# Altium footprint library RODION.PcbLib: 131 footprints (part 4 of 9)
Each footprint in its own frame and in the unit in brackets; x right, y up, seen from the top. Pads: shape width x height; smd on the part's side, far side on the other; paste and mask are expansions set on the pad; w line width, h text height; cw(c..) or ccw(c..) is an arc to the next point about the centre after c.
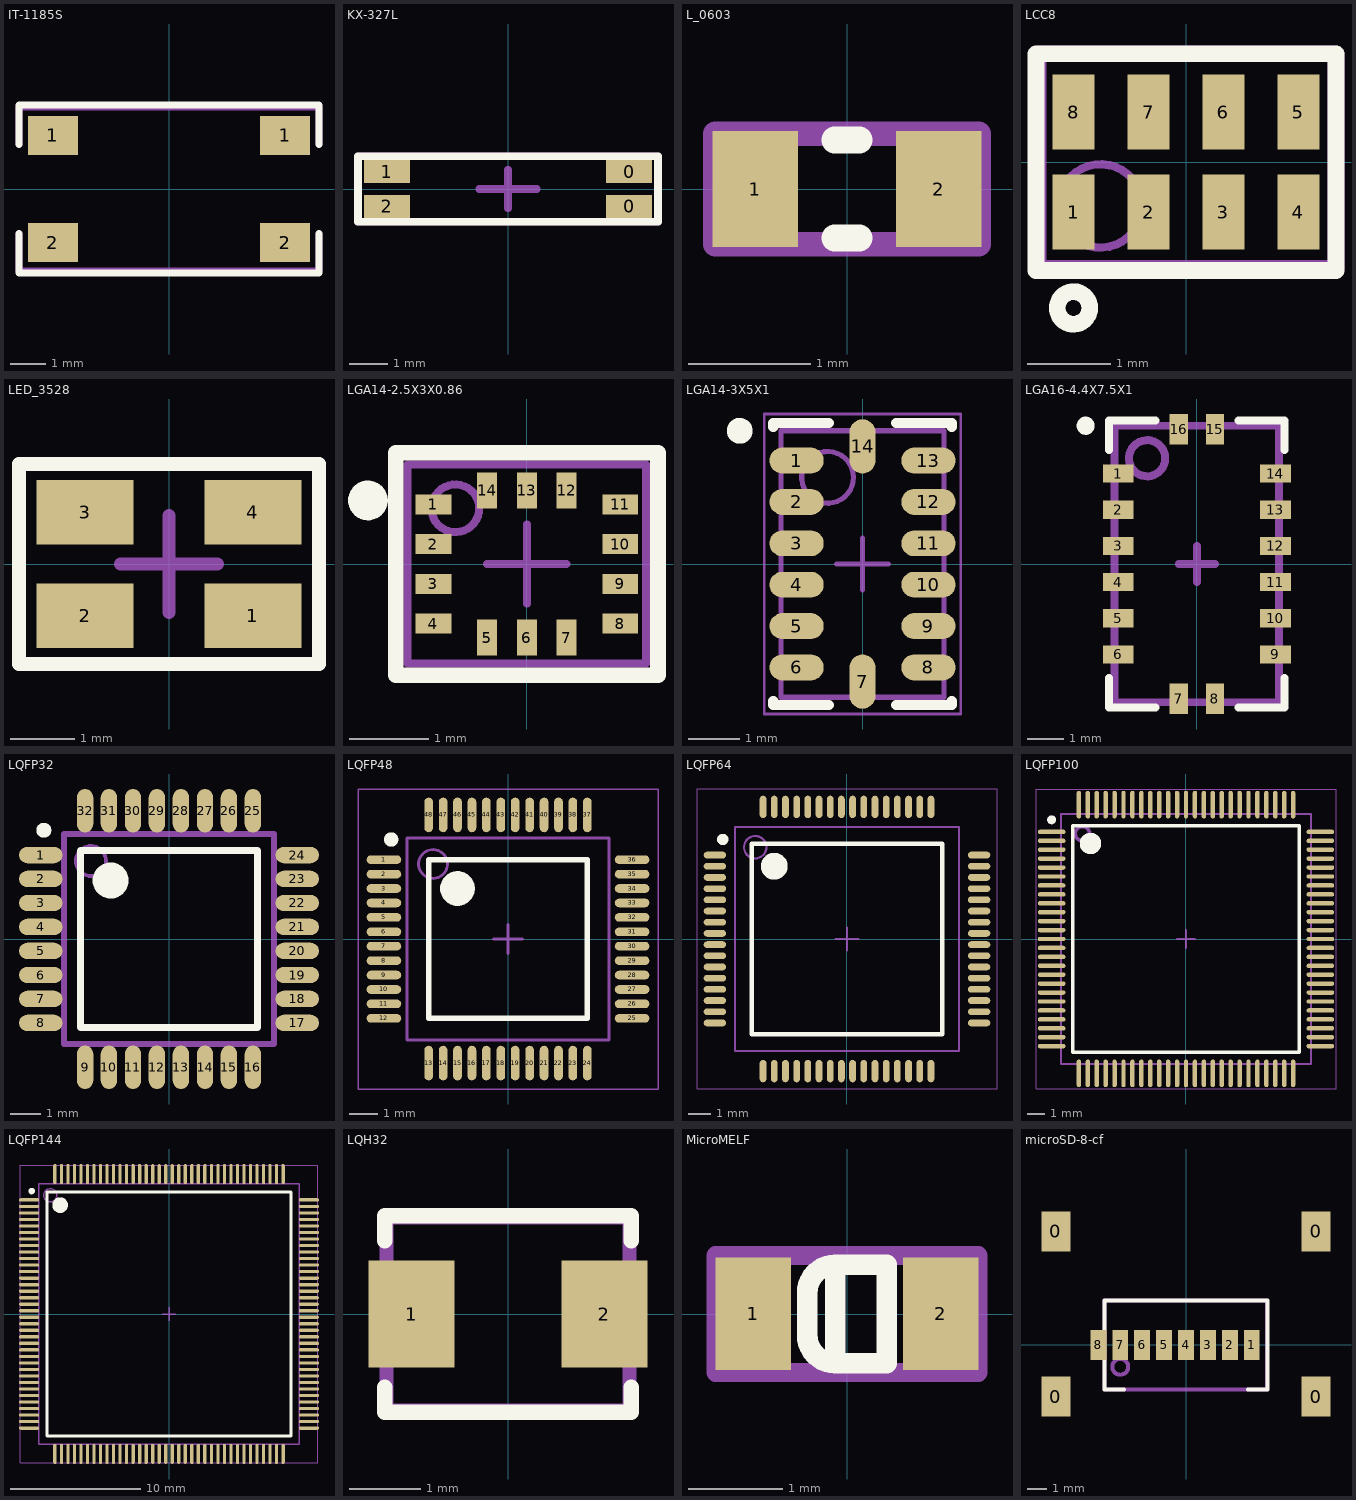
[diagram p3: the footprints below, top view; thin cyan lines are the x and y axes]

## IT-1185S [mm] "Button"
height 3.8
pads (4):
  rect 1.4x1.1 smd: 1(-3.25,1.5) 1(3.25,1.5) 2(-3.25,-1.5) 2(3.25,-1.5)
Top Overlay:
  lines w0.2: -4.2,-1.25 -4.2,-2.35 4.2,-2.35 4.2,-1.25 ; -4.2,1.25 -4.2,2.35 4.2,2.35 4.2,1.25
Top_Assy:
  lines w0.2: -4.2,-1.25 -4.2,-2.3 4.2,-2.3 4.2,-1.25 ; -4.2,1.25 -4.2,2.3 4.2,2.3 4.2,1.25
  text ".Designator" at -2.725,-0.1 h1
3D body "IT-1109S.STP": height 3.8, standoff 0, extent -3.75,-2.25 3.75,2.25

## KX-327L [mm] "GEYER 4pin crystal case, 7*1.5mm"
height 1.4
pads (4):
  rect 1.2x0.6 smd: 0(3.15,-0.45) 0(3.15,0.45) 1(-3.15,0.45) 2(-3.15,-0.45)
Top Overlay:
  lines w0.2: -3.9,-0.85 3.9,-0.85 3.9,0.85 -3.9,0.85 -3.9,-0.85
Top_Assy:
  lines w0.2: -0.75,0 0,0 ; 0,-0.5 0,0 ; 0,0.5 0,0 ; 0.75,0 0,0 ; -3.9,-0.85 3.9,-0.85 3.9,0.85 -3.9,0.85 -3.9,-0.85
3D body "Crystal KX-327LT.step": height 1.4, standoff 0, extent -3.45,-0.75 3.45,0.75

## L_0603 [mm] "Chip, Body 1.6x0.85mm, IPC High Density"
height 0.9
pads (2):
  rect 0.7x0.95 smd mask+0.05: 1(-0.75,0) 2(0.75,0)
Top Overlay:
  lines w0.22: -0.1,-0.4 0.1,-0.4 ; -0.1,0.4 0.1,0.4
Top_Assy:
  lines w0.2: -1.075,-0.45 1.075,-0.45 1.075,0.45 -1.075,0.45 -1.075,-0.45
  text ".Designator" at -0.875,-0.125 h1
3D body "0603.step": height 0.8, standoff 0, extent -0.8,-0.475 0.8,0.475

## LCC8 [mm] "0.5 pitch"
height 0.8
pads (8):
  rect 0.5x0.9 smd: 1(-1.35,-0.6) 2(-0.45,-0.6) 3(0.45,-0.6) 4(1.35,-0.6) 5(1.35,0.6) 6(0.45,0.6) 7(-0.45,0.6) 8(-1.35,0.6)
Top Overlay:
  circle w0.2: c-1.35,-1.75 r0.195
  lines w0.2: -1.8,-1.3 1.8,-1.3 1.8,1.3 -1.8,1.3 -1.8,-1.3
Top_Assy:
  circle w0.1: c-1.025,-0.525 r0.5
  lines w0.2: -1.775,-1.275 -1.775,1.3 1.8,1.3 1.8,-1.275 -1.775,-1.275
  text ".Designator" at -1.225,-0.125 h1
3D body "LCC8.step": height 0.82, standoff 0.02, extent -1.6,-0.75 1.6,0.75

## LED_3528 [mm] "3528 Led 4 pin"
height 1.9
pads (4):
  rect 1.5x1 smd: 1(1.3,-0.8) 2(-1.3,-0.8) 3(-1.3,0.8) 4(1.3,0.8)
Top Overlay:
  lines w0.22: -2.325,-1.55 2.325,-1.55 2.325,1.55 -2.325,1.55 -2.325,-1.55
Top_Assy:
  lines w0.2: -0.75,0 0,0 ; 0,-0.75 0,0 ; 0,0.75 0,0 ; 0.75,0 0,0 ; -2.325,-1.55 2.325,-1.55 2.325,1.55 -2.325,1.55 -2.325,-1.55
3D body "3528 LED.step": height 1.9, standoff 0, extent -1.75,-1.4 1.75,1.4

## LGA14-2.5X3X0.86 [mm] "PQFN, 14-Leads, Body 2.5x3mm, Pitch 0.5mm, IPC High Density"
height 0.86
pads (14):
  rect 0.45x0.25 smd: 1(-1.175,0.75) 2(-1.175,0.25) 3(-1.175,-0.25) 4(-1.175,-0.75) 8(1.175,-0.75) 9(1.175,-0.25) 10(1.175,0.25) 11(1.175,0.75)
  rect 0.25x0.45 smd: 5(-0.5,-0.925) 6(0,-0.925) 7(0.5,-0.925) 12(0.5,0.925) 13(0,0.925) 14(-0.5,0.925)
Top Overlay:
  circle w0.25: c-2,0.8 r0.125
  lines w0.2: -1.65,-1.4 -1.65,1.4 1.65,1.4 1.65,-1.4 -1.65,-1.4
Top_Assy:
  circle w0.1: c-0.9,0.7 r0.3
  lines w0.1: -1.5,-1.25 1.5,-1.25 1.5,1.25 -1.5,1.25 -1.5,-1.25
  text ".Designator" at -1.275,-0.875 h1
Mechanical 15:
  lines w0.1: -0.5,0 0.5,0 ; 0,-0.5 0,0.5
3D body "LGA-14 2.5x3.STEP": height 0.86, standoff 0, extent -1.5,-1.25 1.5,1.25

## LGA14-3X5X1 [mm] "PQFN, 14-Leads, Body 3x5mm, Pitch 0.8mm, IPC High Density"
height 1
pads (14):
  oval 1.05x0.5 smd: 1(-1.275,2) 2(-1.275,1.2) 3(-1.275,0.4) 4(-1.275,-0.4) 5(-1.275,-1.2) 6(-1.275,-2) 8(1.275,-2) 9(1.275,-1.2) 10(1.275,-0.4) 11(1.275,0.4) 12(1.275,1.2) 13(1.275,2)
  oval 0.5x1.05 smd: 7(0,-2.275) 14(0,2.275)
Top Overlay:
  circle w0.25: c-2.375,2.575 r0.125
  lines w0.2: -1.725,-2.65 -1.725,-2.725 -0.65,-2.725 ; -1.725,2.65 -1.725,2.725 -0.65,2.725 ; 0.65,-2.725 1.725,-2.725 1.725,-2.65 ; 0.65,2.725 1.725,2.725 1.725,2.65
Top_Assy:
  circle w0.1: c-0.675,1.675 r0.5
  lines w0.1: -1.575,-2.575 -1.575,2.575 1.575,2.575 1.575,-2.575 -1.575,-2.575
Mechanical 15:
  lines w0.05: -1.9,-2.9 -1.9,2.9 1.9,2.9 1.9,-2.9 -1.9,-2.9
  lines w0.1: -0.5,0 0.5,0 ; 0,-0.5 0,0.5
3D body "LGA-14 3x5.STEP": height 1.03, standoff -0.4, extent -1.49,-2.5 1.51,2.5

## LGA16-4.4X7.5X1 [mm] "PQFN, 16-Leads, Body 4.4x7.5mm, Pitch 1mm, IPC Medium Density"
height 1
pads (16):
  rect 0.85x0.5 smd: 1(-2.175,2.5) 2(-2.175,1.5) 3(-2.175,0.5) 4(-2.175,-0.5) 5(-2.175,-1.5) 6(-2.175,-2.5) 9(2.175,-2.5) 10(2.175,-1.5) 11(2.175,-0.5) 12(2.175,0.5) 13(2.175,1.5) 14(2.175,2.5)
  rect 0.5x0.85 smd: 7(-0.5,-3.725) 8(0.5,-3.725) 15(0.5,3.725) 16(-0.5,3.725)
Top Overlay:
  circle w0.25: c-3.075,3.825 r0.125
  lines w0.22: -2.425,-3.15 -2.425,-3.975 -1.15,-3.975 ; -2.425,3.15 -2.425,3.975 -1.15,3.975 ; 1.15,-3.975 2.425,-3.975 2.425,-3.15 ; 1.15,3.975 2.425,3.975 2.425,3.15
Top_Assy:
  circle w0.22: c-1.375,2.925 r0.5
  lines w0.22: -0.5,0 0.5,0 ; 0,-0.5 0,0.5 ; -2.275,-3.825 -2.275,3.825 2.275,3.825 2.275,-3.825 -2.275,-3.825
3D body: height 1, standoff 0, extent -2.275,-3.825 2.275,3.825

## LQFP32 [mm] "QFP, 32-Leads, Body 7x7mm, Pitch 0.8mm, IPC Medium Density"
height 1.6
pads (32):
  oval 1.45x0.55 smd: 1(-4.275,2.8) 2(-4.275,2) 3(-4.275,1.2) 4(-4.275,0.4) 5(-4.275,-0.4) 6(-4.275,-1.2) 7(-4.275,-2) 8(-4.275,-2.8) 17(4.275,-2.8) 18(4.275,-2) 19(4.275,-1.2) 20(4.275,-0.4) 21(4.275,0.4) 22(4.275,1.2) 23(4.275,2) 24(4.275,2.8)
  oval 0.55x1.45 smd: 9(-2.8,-4.275) 10(-2,-4.275) 11(-1.2,-4.275) 12(-0.4,-4.275) 13(0.4,-4.275) 14(1.2,-4.275) 15(2,-4.275) 16(2.8,-4.275) 25(2.8,4.275) 26(2,4.275) 27(1.2,4.275) 28(0.4,4.275) 29(-0.4,4.275) 30(-1.2,4.275) 31(-2,4.275) 32(-2.8,4.275)
Top Overlay:
  circle w0.25: c-4.175,3.625 r0.125
  circle w0.6: c-1.95,1.95 r0.3
  lines w0.22: -2.95,-2.95 -2.95,2.95 2.95,2.95 2.95,-2.95 -2.95,-2.95
Top_Assy:
  circle w0.127: c-2.6,2.6 r0.5
  lines w0.2: -3.5,-3.5 -3.5,3.5 3.5,3.5 3.5,-3.5 -3.5,-3.5
  text ".Designator" at -2.225,-0.625 h1
3D body "TQFP-32.STEP": height 1.1, standoff 0, extent -4.5,-4.5 4.5,4.5

## LQFP48 [mm] "QFP, 48-Leads, Body 7x7mm, Pitch 0.5mm, IPC Medium Density"
height 1.6
pads (48):
  oval 1.2x0.3 smd: 1(-4.3,2.75) 2(-4.3,2.25) 3(-4.3,1.75) 4(-4.3,1.25) 5(-4.3,0.75) 6(-4.3,0.25) 7(-4.3,-0.25) 8(-4.3,-0.75) 9(-4.3,-1.25) 10(-4.3,-1.75) 11(-4.3,-2.25) 12(-4.3,-2.75) 25(4.3,-2.75) 26(4.3,-2.25) 27(4.3,-1.75) 28(4.3,-1.25) 29(4.3,-0.75) 30(4.3,-0.25) 31(4.3,0.25) 32(4.3,0.75) 33(4.3,1.25) 34(4.3,1.75) 35(4.3,2.25) 36(4.3,2.75)
  oval 0.3x1.2 smd: 13(-2.75,-4.3) 14(-2.25,-4.3) 15(-1.75,-4.3) 16(-1.25,-4.3) 17(-0.75,-4.3) 18(-0.25,-4.3) 19(0.25,-4.3) 20(0.75,-4.3) 21(1.25,-4.3) 22(1.75,-4.3) 23(2.25,-4.3) 24(2.75,-4.3) 37(2.75,4.3) 38(2.25,4.3) 39(1.75,4.3) 40(1.25,4.3) 41(0.75,4.3) 42(0.25,4.3) 43(-0.25,4.3) 44(-0.75,4.3) 45(-1.25,4.3) 46(-1.75,4.3) 47(-2.25,4.3) 48(-2.75,4.3)
Top Overlay:
  circle w0.6: c-1.75,1.75 r0.3
  circle w0.25: c-4.05,3.45 r0.125
  lines w0.2: -2.75,-2.75 2.75,-2.75 2.75,2.75 -2.75,2.75 -2.75,-2.75
Top_Assy:
  circle w0.1: c-2.6,2.6 r0.5
  lines w0.1: -3.5,-3.5 3.5,-3.5 3.5,3.5 -3.5,3.5 -3.5,-3.5
  text ".Designator" at -2.275,-0.25 h1
Mechanical 15:
  lines w0.05: -5.2,-5.2 5.2,-5.2 5.2,5.2 -5.2,5.2 -5.2,-5.2
  lines w0.1: -0.5,0 0.5,0 ; 0,-0.5 0,0.5
3D body "LQFP48_Grid_0_5.X_B": height 1.6, standoff 0, extent -4.5,-4.5 4.5,4.5

## LQFP64 [mm] "Thin QFP, 64-Leads, Body 10x10mm, Pitch 0.5mm, IPC Medium Density"
height 1.6
pads (64):
  oval 1x0.3 smd: 1(-5.9,3.75) 2(-5.9,3.25) 3(-5.9,2.75) 4(-5.9,2.25) 5(-5.9,1.75) 6(-5.9,1.25) 7(-5.9,0.75) 8(-5.9,0.25) 9(-5.9,-0.25) 10(-5.9,-0.75) 11(-5.9,-1.25) 12(-5.9,-1.75) 13(-5.9,-2.25) 14(-5.9,-2.75) 15(-5.9,-3.25) 16(-5.9,-3.75) 33(5.9,-3.75) 34(5.9,-3.25) 35(5.9,-2.75) 36(5.9,-2.25) 37(5.9,-1.75) 38(5.9,-1.25) 39(5.9,-0.75) 40(5.9,-0.25) 41(5.9,0.25) 42(5.9,0.75) 43(5.9,1.25) 44(5.9,1.75) 45(5.9,2.25) 46(5.9,2.75) 47(5.9,3.25) 48(5.9,3.75)
  oval 0.3x1 smd: 17(-3.75,-5.9) 18(-3.25,-5.9) 19(-2.75,-5.9) 20(-2.25,-5.9) 21(-1.75,-5.9) 22(-1.25,-5.9) 23(-0.75,-5.9) 24(-0.25,-5.9) 25(0.25,-5.9) 26(0.75,-5.9) 27(1.25,-5.9) 28(1.75,-5.9) 29(2.25,-5.9) 30(2.75,-5.9) 31(3.25,-5.9) 32(3.75,-5.9) 49(3.75,5.9) 50(3.25,5.9) 51(2.75,5.9) 52(2.25,5.9) 53(1.75,5.9) 54(1.25,5.9) 55(0.75,5.9) 56(0.25,5.9) 57(-0.25,5.9) 58(-0.75,5.9) 59(-1.25,5.9) 60(-1.75,5.9) 61(-2.25,5.9) 62(-2.75,5.9) 63(-3.25,5.9) 64(-3.75,5.9)
Top Overlay:
  circle w0.6: c-3.25,3.25 r0.3
  circle w0.25: c-5.55,4.45 r0.125
  lines w0.2: -4.25,-4.25 4.25,-4.25 4.25,4.25 -4.25,4.25 -4.25,-4.25
Top_Assy:
  circle w0.1: c-4.1,4.1 r0.5
  lines w0.1: -5,-5 5,-5 5,5 -5,5 -5,-5
  text ".Designator" at -3.25,-0.2 h1
Mechanical 15:
  lines w0.05: -6.7,-6.7 6.7,-6.7 6.7,6.7 -6.7,6.7 -6.7,-6.7
  lines w0.1: -0.5,0 0.5,0 ; 0,-0.5 0,0.5
3D body "LQFP64_Grid_0_5.STEP": height 1.6, standoff 0, extent -6,-6 6,6

## LQFP100 [mm] "Thin QFP, 100-Leads, Body 14x14mm, Pitch 0.5mm, IPC High Density"
height 1.6
pads (100):
  oval 1.55x0.25 smd: 1(-7.525,6) 2(-7.525,5.5) 3(-7.525,5) 4(-7.525,4.5) 5(-7.525,4) 6(-7.525,3.5) 7(-7.525,3) 8(-7.525,2.5) 9(-7.525,2) 10(-7.525,1.5) 11(-7.525,1) 12(-7.525,0.5) 13(-7.525,0) 14(-7.525,-0.5) 15(-7.525,-1) 16(-7.525,-1.5) 17(-7.525,-2) 18(-7.525,-2.5) 19(-7.525,-3) 20(-7.525,-3.5) 21(-7.525,-4) 22(-7.525,-4.5) 23(-7.525,-5) 24(-7.525,-5.5) 25(-7.525,-6) 51(7.525,-6) 52(7.525,-5.5) 53(7.525,-5) 54(7.525,-4.5) 55(7.525,-4) 56(7.525,-3.5) 57(7.525,-3) 58(7.525,-2.5) 59(7.525,-2) 60(7.525,-1.5) 61(7.525,-1) 62(7.525,-0.5) 63(7.525,0) 64(7.525,0.5) 65(7.525,1) 66(7.525,1.5) 67(7.525,2) 68(7.525,2.5) 69(7.525,3) 70(7.525,3.5) 71(7.525,4) 72(7.525,4.5) 73(7.525,5) 74(7.525,5.5) 75(7.525,6)
  oval 0.25x1.55 smd: 26(-6,-7.525) 27(-5.5,-7.525) 28(-5,-7.525) 29(-4.5,-7.525) 30(-4,-7.525) 31(-3.5,-7.525) 32(-3,-7.525) 33(-2.5,-7.525) 34(-2,-7.525) 35(-1.5,-7.525) 36(-1,-7.525) 37(-0.5,-7.525) 38(0,-7.525) 39(0.5,-7.525) 40(1,-7.525) 41(1.5,-7.525) 42(2,-7.525) 43(2.5,-7.525) 44(3,-7.525) 45(3.5,-7.525) 46(4,-7.525) 47(4.5,-7.525) 48(5,-7.525) 49(5.5,-7.525) 50(6,-7.525) 76(6,7.525) 77(5.5,7.525) 78(5,7.525) 79(4.5,7.525) 80(4,7.525) 81(3.5,7.525) 82(3,7.525) 83(2.5,7.525) 84(2,7.525) 85(1.5,7.525) 86(1,7.525) 87(0.5,7.525) 88(0,7.525) 89(-0.5,7.525) 90(-1,7.525) 91(-1.5,7.525) 92(-2,7.525) 93(-2.5,7.525) 94(-3,7.525) 95(-3.5,7.525) 96(-4,7.525) 97(-4.5,7.525) 98(-5,7.525) 99(-5.5,7.525) 100(-6,7.525)
Top Overlay:
  circle w0.6: c-5.35,5.35 r0.3
  circle w0.25: c-7.525,6.675 r0.125
  lines w0.2: -6.35,-6.35 6.35,-6.35 6.35,6.35 -6.35,6.35 -6.35,-6.35
Top_Assy:
  circle w0.2: c-5.8,5.9 r0.4
  lines w0.1: -7,-7 7,-7 7,7 -7,7 -7,-7
  text ".Designator" at -4.325,-0.4 h1
Mechanical 15:
  lines w0.05: -8.4,-8.4 8.4,-8.4 8.4,8.4 -8.4,8.4 -8.4,-8.4
  lines w0.1: -0.5,0 0.5,0 ; 0,-0.5 0,0.5
3D body "LQFP100_Grid_0.5.step": height 1.6, standoff 0, extent -8,-8 8,8

## LQFP144 [mm] "Thin QFP, 144-Leads, Body 20x20mm, Pitch 0.5mm, IPC High Density"
height 1.6
pads (144):
  oval 1.55x0.25 smd: 1(-10.725,8.75) 2(-10.725,8.25) 3(-10.725,7.75) 4(-10.725,7.25) 5(-10.725,6.75) 6(-10.725,6.25) 7(-10.725,5.75) 8(-10.725,5.25) 9(-10.725,4.75) 10(-10.725,4.25) 11(-10.725,3.75) 12(-10.725,3.25) 13(-10.725,2.75) 14(-10.725,2.25) 15(-10.725,1.75) 16(-10.725,1.25) 17(-10.725,0.75) 18(-10.725,0.25) 19(-10.725,-0.25) 20(-10.725,-0.75) 21(-10.725,-1.25) 22(-10.725,-1.75) 23(-10.725,-2.25) 24(-10.725,-2.75) 25(-10.725,-3.25) 26(-10.725,-3.75) 27(-10.725,-4.25) 28(-10.725,-4.75) 29(-10.725,-5.25) 30(-10.725,-5.75) 31(-10.725,-6.25) 32(-10.725,-6.75) 33(-10.725,-7.25) 34(-10.725,-7.75) 35(-10.725,-8.25) 36(-10.725,-8.75) 73(10.725,-8.75) 74(10.725,-8.25) 75(10.725,-7.75) 76(10.725,-7.25) 77(10.725,-6.75) 78(10.725,-6.25) 79(10.725,-5.75) 80(10.725,-5.25) 81(10.725,-4.75) 82(10.725,-4.25) 83(10.725,-3.75) 84(10.725,-3.25) 85(10.725,-2.75) 86(10.725,-2.25) 87(10.725,-1.75) 88(10.725,-1.25) 89(10.725,-0.75) 90(10.725,-0.25) 91(10.725,0.25) 92(10.725,0.75) 93(10.725,1.25) 94(10.725,1.75) 95(10.725,2.25) 96(10.725,2.75) 97(10.725,3.25) 98(10.725,3.75) 99(10.725,4.25) 100(10.725,4.75) 101(10.725,5.25) 102(10.725,5.75) 103(10.725,6.25) 104(10.725,6.75) 105(10.725,7.25) 106(10.725,7.75) 107(10.725,8.25) 108(10.725,8.75)
  oval 0.25x1.55 smd: 37(-8.75,-10.725) 38(-8.25,-10.725) 39(-7.75,-10.725) 40(-7.25,-10.725) 41(-6.75,-10.725) 42(-6.25,-10.725) 43(-5.75,-10.725) 44(-5.25,-10.725) 45(-4.75,-10.725) 46(-4.25,-10.725) 47(-3.75,-10.725) 48(-3.25,-10.725) 49(-2.75,-10.725) 50(-2.25,-10.725) 51(-1.75,-10.725) 52(-1.25,-10.725) 53(-0.75,-10.725) 54(-0.25,-10.725) 55(0.25,-10.725) 56(0.75,-10.725) 57(1.25,-10.725) 58(1.75,-10.725) 59(2.25,-10.725) 60(2.75,-10.725) 61(3.25,-10.725) 62(3.75,-10.725) 63(4.25,-10.725) 64(4.75,-10.725) 65(5.25,-10.725) 66(5.75,-10.725) 67(6.25,-10.725) 68(6.75,-10.725) 69(7.25,-10.725) 70(7.75,-10.725) 71(8.25,-10.725) 72(8.75,-10.725) 109(8.75,10.725) 110(8.25,10.725) 111(7.75,10.725) 112(7.25,10.725) 113(6.75,10.725) 114(6.25,10.725) 115(5.75,10.725) 116(5.25,10.725) 117(4.75,10.725) 118(4.25,10.725) 119(3.75,10.725) 120(3.25,10.725) 121(2.75,10.725) 122(2.25,10.725) 123(1.75,10.725) 124(1.25,10.725) 125(0.75,10.725) 126(0.25,10.725) 127(-0.25,10.725) 128(-0.75,10.725) 129(-1.25,10.725) 130(-1.75,10.725) 131(-2.25,10.725) 132(-2.75,10.725) 133(-3.25,10.725) 134(-3.75,10.725) 135(-4.25,10.725) 136(-4.75,10.725) 137(-5.25,10.725) 138(-5.75,10.725) 139(-6.25,10.725) 140(-6.75,10.725) 141(-7.25,10.725) 142(-7.75,10.725) 143(-8.25,10.725) 144(-8.75,10.725)
Top Overlay:
  circle w0.6: c-8.35,8.35 r0.3
  circle w0.25: c-10.525,9.425 r0.125
  lines w0.2: -9.35,-9.35 9.35,-9.35 9.35,9.35 -9.35,9.35 -9.35,-9.35
Top_Assy:
  circle w0.1: c-9.1,9.1 r0.5
  lines w0.1: -10,-10 10,-10 10,10 -10,10 -10,-10
Mechanical 15:
  lines w0.05: -11.4,-11.4 11.4,-11.4 11.4,11.4 -11.4,11.4 -11.4,-11.4
  lines w0.1: -0.5,0 0.5,0 ; 0,-0.5 0,0.5
3D body "User Library-LQFP144-3.STEP": height 1.88, standoff -0.01, extent -11.101,-11.101 11.101,11.101

## LQH32 [mm] "Chip Inductor, Body 3.2*2.5mm"
height 1.55
pads (2):
  rect 1.2x1.5 smd: 1(-1.35,0) 2(1.35,0)
Top Overlay:
  lines w0.22: -1.725,-1.375 -1.725,-1.025 ; -1.725,1.025 -1.725,1.375 1.7,1.375 ; -1.7,-1.375 1.725,-1.375 1.725,-1.025 ; 1.725,1.025 1.725,1.375
Top_Assy:
  lines w0.2: -1.7,-1.35 -1.7,1.35 1.7,1.35 1.7,-1.35 -1.7,-1.35
  text ".Designator" at -1.825,-0.125 h1
3D body "LQH32PN_sw.step": height 1.55, standoff 0, extent -1.6,-1.25 1.6,1.25

## MicroMELF [mm] "Chip, Body 3.7x1.6mm"
height 1.2
pads (2):
  rect 0.8x1.2 smd: 1(-1,0) 2(1,0)
Top Overlay:
  lines w0.22: -0.125,-0.525 cw(c-0.125,-0.225) -0.425,-0.225 -0.425,0.225 cw(c-0.125,0.225) -0.125,0.525 ; -0.125,-0.525 -0.125,0.525 ; -0.125,-0.525 0.425,-0.525 0.425,0.525 -0.125,0.525
Top_Assy:
  lines w0.2: -1.4,-0.625 1.4,-0.625 1.4,0.625 -1.4,0.625 -1.4,-0.625
  text ".Designator" at -1.2,-0.35 h1
3D body "Micromelf-1.STEP": height 1.22, standoff 0.02, extent -0.9,-0.6 0.9,0.6

## microSD-8-cf [mm] "microSD-8-cf, microSD card connector"
height 1.8
pads (12):
  rect 1.45x2 smd: 0(-6.53,-2.6) 0(-6.53,5.7) 0(6.53,-2.6) 0(6.53,5.7)
  rect 0.8x1.5 smd: 1(3.3,0) 2(2.2,0) 3(1.1,0) 4(0,0) 5(-1.1,0) 6(-2.2,0) 7(-3.3,0) 8(-4.4,0)
Top Overlay:
  lines w0.2: -3.1,-2.23 -4.1,-2.23 -4.1,2.23 4.1,2.23 4.1,-2.23 3.1,-2.23
Top_Assy:
  circle w0.2: c-3.3,-1.1 r0.4
  lines w0.2: -4.1,-2.23 4.075,-2.23 4.075,2.23 -4.1,2.23 -4.1,-2.23
  text ".Designator" at -3.5,0.6 h1
3D body "User Library-5009010801.step": height 1.93, standoff -0.02, extent -7.3,-5.15 7.3,9.35